# Altium footprint library footprints.PcbLib: 25 footprints (part 1 of 2)
Each footprint in its own frame and in the unit in brackets; x right, y up, seen from the top. Pads: shape width x height; smd on the part's side, far side on the other; paste and mask are expansions set on the pad; w line width, h text height; cw(c..) or ccw(c..) is an arc to the next point about the centre after c.
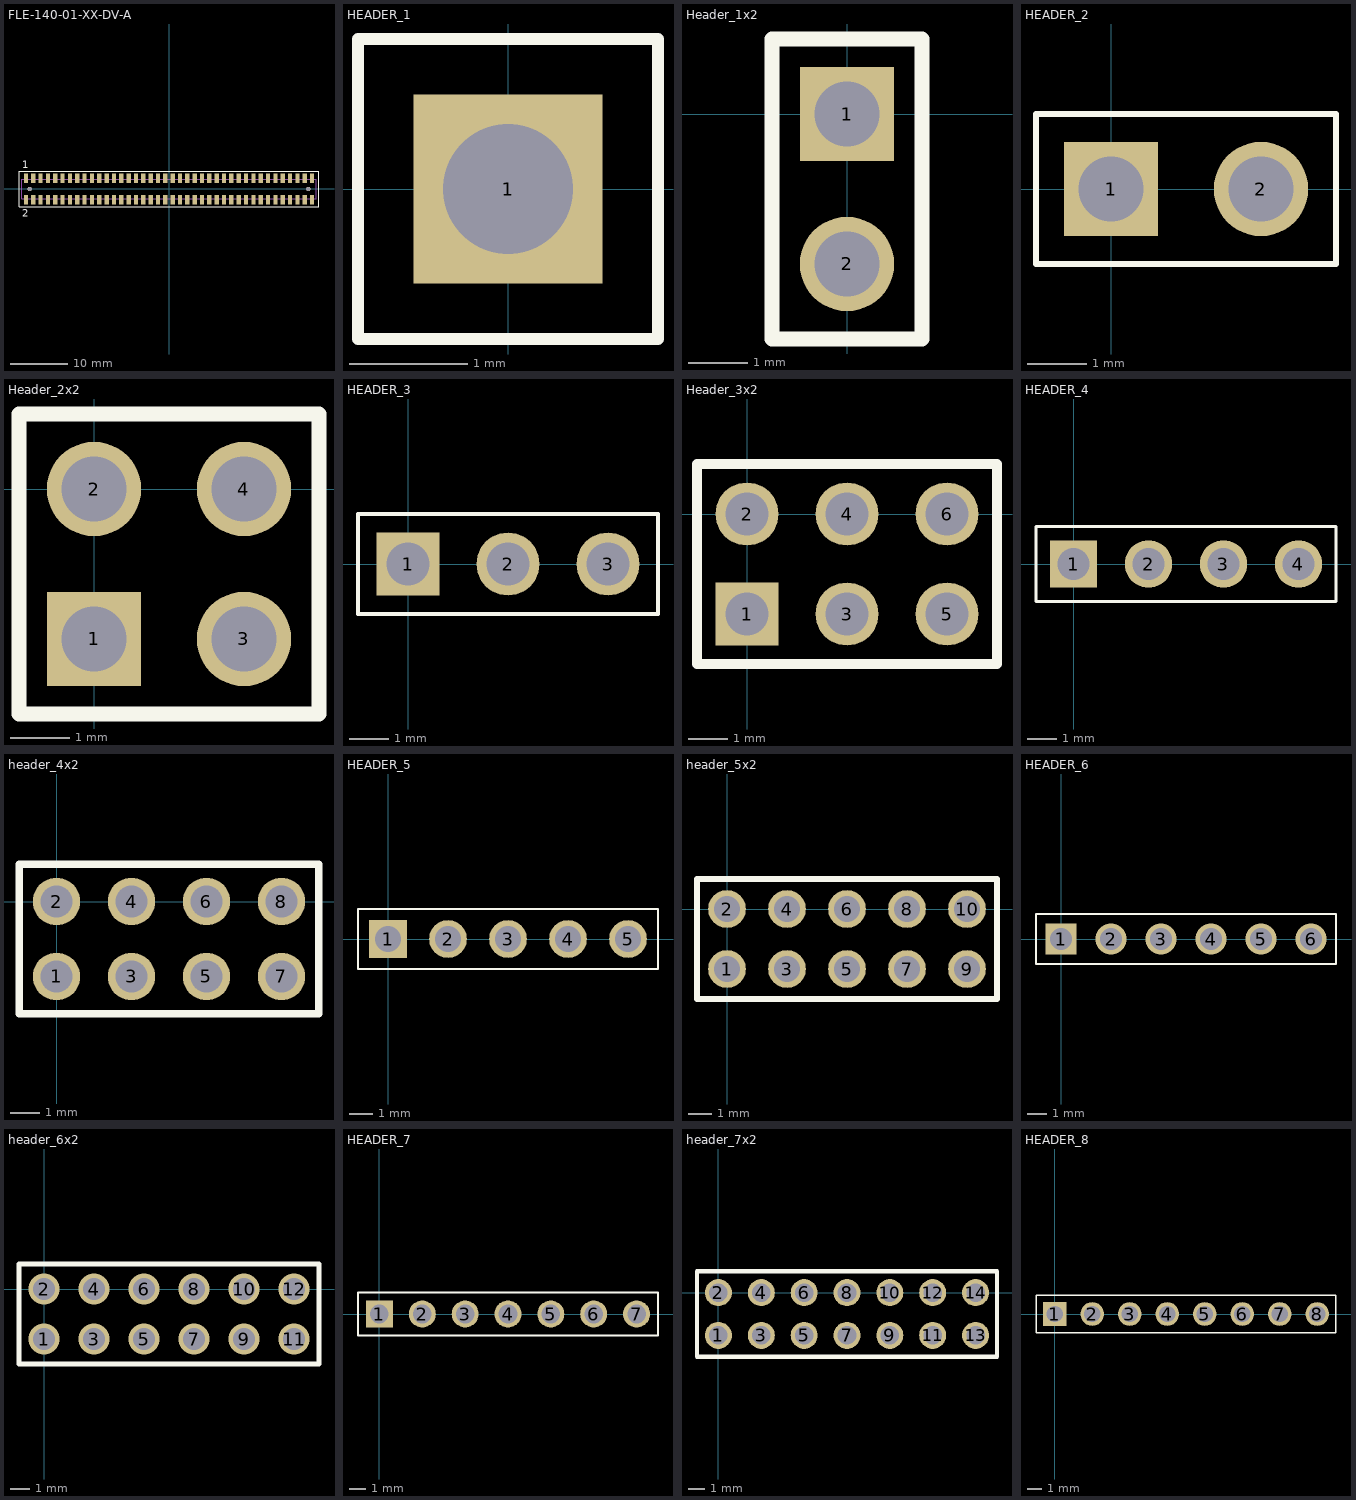
[diagram p0: the footprints below, top view; thin cyan lines are the x and y axes]

## FLE-140-01-XX-DV-A [mil]
pads (82):
  rect 29x66 smd: 1(-975,72.5) 2(-975,-72.5) 3(-925,72.5) 4(-925,-72.5) 5(-875,72.5) 6(-875,-72.5) 7(-825,72.5) 8(-825,-72.5) 9(-775,72.5) 10(-775,-72.5) 11(-725,72.5) 12(-725,-72.5) 13(-675,72.5) 14(-675,-72.5) 15(-625,72.5) 16(-625,-72.5) 17(-575,72.5) 18(-575,-72.5) 19(-525,72.5) 20(-525,-72.5) 21(-475,72.5) 22(-475,-72.5) 23(-425,72.5) 24(-425,-72.5) 25(-375,72.5) 26(-375,-72.5) 27(-325,72.5) 28(-325,-72.5) 29(-275,72.5) 30(-275,-72.5) 31(-225,72.5) 32(-225,-72.5) 33(-175,72.5) 34(-175,-72.5) 35(-125,72.5) 36(-125,-72.5) 37(-75,72.5) 38(-75,-72.5) 39(-25,72.5) 40(-25,-72.5) 41(25,72.5) 42(25,-72.5) 43(75,72.5) 44(75,-72.5) 45(125,72.5) 46(125,-72.5) 47(175,72.5) 48(175,-72.5) 49(225,72.5) 50(225,-72.5) 51(275,72.5) 52(275,-72.5) 53(325,72.5) 54(325,-72.5) 55(375,72.5) 56(375,-72.5) 57(425,72.5) 58(425,-72.5) 59(475,72.5) 60(475,-72.5) 61(525,72.5) 62(525,-72.5) 63(575,72.5) 64(575,-72.5) 65(625,72.5) 66(625,-72.5) 67(675,72.5) 68(675,-72.5) 69(725,72.5) 70(725,-72.5) 71(775,72.5) 72(775,-72.5) 73(825,72.5) 74(825,-72.5) 75(875,72.5) 76(875,-72.5) 77(925,72.5) 78(925,-72.5) 79(975,72.5) 80(975,-72.5)
  round 30 hole 30 unplated: ""(-950,0) ""(950,0)
Top Overlay:
  lines w5: -1022,-120.5 1022,-120.5 1022,120.5 -1022,120.5 -1022,-120.5
  text "1" at -1000.93,140.13 h50.05
  text "2" at -1001.12,-190.21 h50.06
Mechanical 13:
  lines w5: -1002,-65.5 1002,-65.5 1002,65.5 -1002,65.5 -1002,-65.5
3D body "FLE-140-01-G-DV-A.stp": height 179.5, standoff -22.5, extent -1002.25,-90.45 1002.25,90.45

## HEADER_1 [mm]
pads (1):
  rect 1.6x1.6 hole 1.1: 1(0,0)
Top Overlay:
  lines w0.1: -1.27,-1.27 -1.27,1.27 1.27,1.27 1.27,-1.27 -1.27,-1.27
3D body "Header 1.step": height 13.04, standoff -2.5, extent -1.27,-1.27 1.27,1.27

## Header_1x2 [mm]
pads (2):
  rect 1.6x1.6 hole 1.1: 1(0,0)
  round 1.6 hole 1.1: 2(0,-2.54)
Top Overlay:
  lines w0.254: -1.27,-3.81 1.27,-3.81 1.27,1.27 -1.27,1.27 -1.27,-3.81
3D body "Header 2.step": height 13.04, standoff -2.5, extent -1.27,-3.81 1.27,1.27

## HEADER_2 [mm]
pads (2):
  rect 1.6x1.6 hole 1.1: 1(0,0)
  round 1.6 hole 1.1: 2(2.54,0)
Top Overlay:
  lines w0.1: -1.27,-1.27 -1.27,1.27 3.81,1.27 3.81,-1.27 -1.27,-1.27
3D body "Header 2.step": height 13.04, standoff -2.5, extent -1.249,-1.288 3.831,1.252

## Header_2x2 [mm]
pads (4):
  rect 1.6x1.6 hole 1.1: 1(0,-2.54)
  round 1.6 hole 1.1: 2(0,0) 3(2.54,-2.54) 4(2.54,0)
Top Overlay:
  lines w0.254: -1.27,-3.81 3.81,-3.81 3.81,1.27 -1.27,1.27 -1.27,-3.81
3D body "Header 2x2.step": height 13.04, standoff -2.5, extent -1.27,-3.81 3.81,1.27

## HEADER_3 [mm]
pads (3):
  rect 1.6x1.6 hole 1.1: 1(0,0)
  round 1.6 hole 1.1: 2(2.54,0) 3(5.08,0)
Top Overlay:
  lines w0.1: -1.27,-1.27 -1.27,1.27 6.35,1.27 6.35,-1.27 -1.27,-1.27
3D body "Header 3.step": height 13.04, standoff -2.5, extent -1.26,-1.272 6.36,1.268

## Header_3x2 [mm]
pads (6):
  rect 1.6x1.6 hole 1.1: 1(0,-2.54)
  round 1.6 hole 1.1: 2(0,0) 3(2.54,-2.54) 4(2.54,0) 5(5.08,-2.54) 6(5.08,0)
Top Overlay:
  lines w0.254: -1.27,-3.81 6.35,-3.81 6.35,1.27 -1.27,1.27 -1.27,-3.81
3D body "Header 3x2.step": height 13.04, standoff -2.5, extent -1.27,-3.81 6.35,1.27

## HEADER_4 [mm]
pads (4):
  rect 1.6x1.6 hole 1.1: 1(0,0)
  round 1.6 hole 1.1: 2(2.54,0) 3(5.08,0) 4(7.62,0)
Top Overlay:
  lines w0.1: -1.27,-1.27 8.89,-1.27 8.89,1.27 -1.27,1.27 -1.27,-1.27
3D body "Header 4.step": height 13.04, standoff -2.5, extent -1.314,-1.264 8.846,1.276

## header_4x2 [mm]
pads (8):
  round 1.6 hole 1.1: 1(0,-2.54) 2(0,0) 3(2.54,-2.54) 4(2.54,0) 5(5.08,-2.54) 6(5.08,0) 7(7.62,-2.54) 8(7.62,0)
Top Overlay:
  lines w0.254: -1.27,-3.81 -1.27,1.27 8.89,1.27 8.89,-3.81 -1.27,-3.81
3D body "Header 4x2.step": height 13.04, standoff -2.5, extent -1.27,-3.81 8.89,1.27

## HEADER_5 [mm]
pads (5):
  rect 1.6x1.6 hole 1.1: 1(0,0)
  round 1.6 hole 1.1: 2(2.54,0) 3(5.08,0) 4(7.62,0) 5(10.16,0)
Top Overlay:
  lines w0.1: -1.27,-1.27 -1.27,1.27 11.43,1.27 11.43,-1.27 -1.27,-1.27
3D body "Header 5.step": height 13.04, standoff -2.5, extent -1.306,-1.304 11.394,1.236

## header_5x2 [mm]
pads (10):
  round 1.6 hole 1.1: 1(0,-2.54) 2(0,0) 3(2.54,-2.54) 4(2.54,0) 5(5.08,-2.54) 6(5.08,0) 7(7.62,-2.54) 8(7.62,0) 9(10.16,-2.54) 10(10.16,0)
Top Overlay:
  lines w0.254: -1.27,-3.81 11.43,-3.81 11.43,1.27 -1.27,1.27 -1.27,-3.81
3D body "Header 5x2.step": height 13.04, standoff -2.5, extent -1.27,-3.81 11.43,1.27

## HEADER_6 [mm]
pads (6):
  rect 1.6x1.6 hole 1.1: 1(0,0)
  round 1.6 hole 1.1: 2(2.54,0) 3(5.08,0) 4(7.62,0) 5(10.16,0) 6(12.7,0)
Top Overlay:
  lines w0.1: -1.27,-1.27 13.97,-1.27 13.97,1.27 -1.27,1.27 -1.27,-1.27
3D body "Header 6.step": height 13.04, standoff -2.5, extent -1.22,-1.286 14.02,1.254

## header_6x2 [mm]
pads (12):
  round 1.6 hole 1.1: 1(0,-2.54) 2(0,0) 3(2.54,-2.54) 4(2.54,0) 5(5.08,-2.54) 6(5.08,0) 7(7.62,-2.54) 8(7.62,0) 9(10.16,-2.54) 10(10.16,0) 11(12.7,-2.54) 12(12.7,0)
Top Overlay:
  lines w0.254: -1.27,-3.81 13.97,-3.81 13.97,1.27 -1.27,1.27 -1.27,-3.81
3D body "Header 6x2.step": height 13.04, standoff -2.5, extent -1.27,-3.81 13.97,1.27

## HEADER_7 [mm]
pads (7):
  rect 1.6x1.6 hole 1.1: 1(0,0)
  round 1.6 hole 1.1: 2(2.54,0) 3(5.08,0) 4(7.62,0) 5(10.16,0) 6(12.7,0) 7(15.24,0)
Top Overlay:
  lines w0.1: -1.27,-1.27 16.51,-1.27 16.51,1.27 -1.27,1.27 -1.27,-1.27
3D body "Header 7.step": height 13.04, standoff -2.5, extent -1.266,-1.265 16.514,1.275

## header_7x2 [mm]
pads (14):
  round 1.6 hole 1.1: 1(0,-2.54) 2(0,0) 3(2.54,-2.54) 4(2.54,0) 5(5.08,-2.54) 6(5.08,0) 7(7.62,-2.54) 8(7.62,0) 9(10.16,-2.54) 10(10.16,0) 11(12.7,-2.54) 12(12.7,0) 13(15.24,-2.54) 14(15.24,0)
Top Overlay:
  lines w0.254: -1.27,-3.81 -1.27,1.27 16.51,1.27 16.51,-3.81 -1.27,-3.81
3D body "Header 7x2.step": height 13.04, standoff -2.5, extent -1.27,-3.81 16.51,1.27

## HEADER_8 [mm]
pads (8):
  rect 1.6x1.6 hole 1.1: 1(0,0)
  round 1.6 hole 1.1: 2(2.54,0) 3(5.08,0) 4(7.62,0) 5(10.16,0) 6(12.7,0) 7(15.24,0) 8(17.78,0)
Top Overlay:
  lines w0.1: -1.27,-1.27 -1.27,1.27 19.05,1.27 19.05,-1.27 -1.27,-1.27
3D body "Header 8.step": height 13.04, standoff -2.5, extent -1.249,-1.267 19.071,1.273